# Altium footprint library Library.PcbLib: 308 footprints (part 10 of 21)
Each footprint in its own frame and in the unit in brackets; x right, y up, seen from the top. Pads: shape width x height; smd on the part's side, far side on the other; paste and mask are expansions set on the pad; w line width, h text height; cw(c..) or ccw(c..) is an arc to the next point about the centre after c.
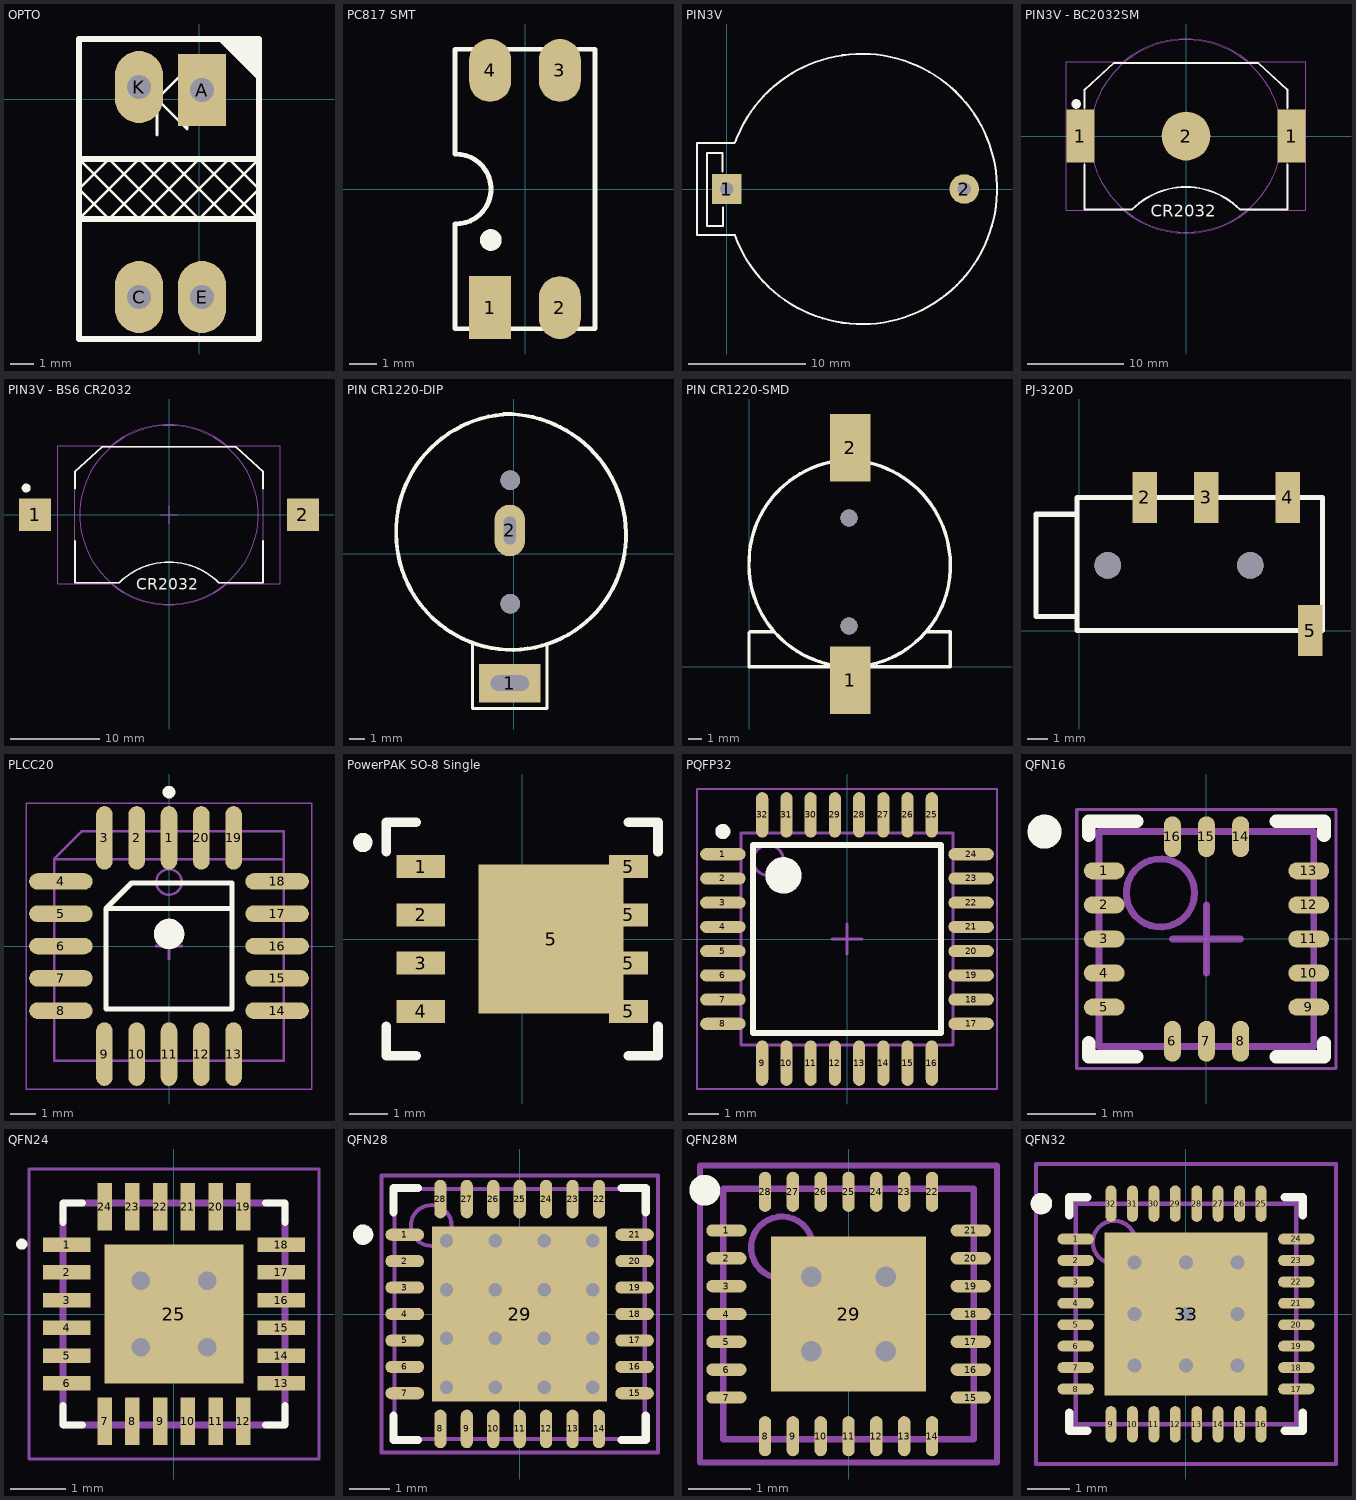
[diagram p9: the footprints below, top view; thin cyan lines are the x and y axes]

## OPTO [mil] "Opto hinh chu U"
height 104.33
pads (4):
  rect 80x120 hole 40: A(5,15)
  oval 80x120 hole 40: C(-100,-330) E(5,-330) K(-100,20)
Top Overlay:
  region: 97.5,97.5 32.5,97.5 97.5,32.5
  lines w5: -200,-200 -150,-150 -100,-100 0,-200 30,-170 100,-100 100,-200 0,-100 -100,-200 -110,-190 -140,-160 -200,-100 ; -70,-60 -70,60 ; -20,-50 -20,50 ; -20,-50 -20,50 ; -20,-50 -70,0 -20,50 ; -200,-150 -170,-180 -150,-200 -50,-100 50,-200 100,-150 50,-100 -50,-200 -150,-100 -200,-150
  lines w10: -200,-200 100,-200 ; -200,-150 -200,-110 ; -200,-100 100,-100 ; 100,-150 100,-140 ; -200,-400 100,-400 100,100 -200,100 -200,-400
3D body "SW3dPS-ee-sx-1041.STEP": height 394.3, standoff -196.25, extent -166,-430.59 70.22,120.59

## PC817 SMT [mil]
pads (4):
  rect 60x90 smd: 1(-50,-169.69)
  oval 60x90 smd: 2(50,-169.69) 3(50,169.69) 4(-50,169.69)
Top Overlay:
  circle w15: c-49,-73 r8
  lines w7: -100.38,-49.95 ccw(c-98.69,0.02) -100,50 ; -100,-50 -100,-200 100,-200 100,200 -100,200 -100,51
3D body "User Library-PC817_Gullwing.STEP": height 151.57, standoff -0.06, extent -90.16,-196.85 90.16,196.85

## PIN3V [mil] "Socket PIN 3V"
pads (2):
  rect 100x100 hole 45: 1(0,0)
  round 100 hole 45: 2(800,0)
Top Overlay:
  lines w7: -14,59 -14,121 -66,121 -66,-124 -13,-124 -13,-63 ; 26.33,155 -100,155 -100,-155 27.93,-155 ; 27.6,156.07 cw(c455,0) 27.93,-156.97
3D body "batter2.STEP": height 278.16, standoff -137.2, extent -128.09,-446.83 1001.83,448.83

## PIN3V - BC2032SM [mm] "CN-DIN, 3-Leads, Body 21.08x15.24mm"
height 4.57
pads (3):
  rect 2.9x5.5 smd: 1(-10.985,0) 1(10.985,0)
  round 5.08 smd: 2(0,0)
Top Overlay:
  circle w0.5: c-11.426,3.34 r0.25
  lines w0.2: -10.54,-2.94 -10.54,-7.62 -5.59,-7.62 cw(c0,-13.21) 5.591,-7.62 10.541,-7.62 ; -10.54,2.94 -10.54,4.83 -7.49,7.62 7.49,7.62 ; 7.49,7.621 10.54,4.83 10.54,2.94 ; 10.54,-7.62 10.54,-2.94
  text "CR2032" at -3.683,-8.382 h1.27
Mechanical 13:
  circle w0.1: c0,0 r10
  lines w0.1: 7.49,7.62 -7.49,7.62 -10.54,4.83 -10.54,2.94 -10.54,-2.94 -10.54,-7.62 -5.59,-7.62 cw(c0,-13.21) 5.591,-7.62 10.541,-7.62 ; 7.49,7.621 10.54,4.83 10.54,2.94 10.54,-2.94 10.54,-7.62
Mechanical 15:
  lines w0.05: -6.492,-7.737 ccw(c0,0) 6.492,-7.737 ; -6.492,7.72 -12.48,7.72 -12.48,-7.72 -6.477,-7.72 ; -6.492,7.738 cw(c0,0) 6.491,7.738 ; 6.477,-7.72 12.48,-7.72 12.48,7.72 6.491,7.72
  lines w0.1: -1,0 1,0 ; 0,-1 0,1
3D body: height 0.25, standoff 0, extent -1272.54,-1272.54 -1267.46,-1267.46
3D body "Linx 2032 Battery Holder.sldprt": height 4.4, standoff 0, extent -11.684,-7.688 11.816,7.366

## PIN3V - BS6 CR2032 [mm]
pads (2):
  rect 3.6x3.6 smd: 1(-15,0) 2(15,0)
Top Overlay:
  circle w0.5: c-16,3 r0.25
  lines w0.2: -10.54,-2.94 -10.54,-7.62 -5.59,-7.62 cw(c0.001,-13.21) 5.591,-7.62 10.541,-7.62 ; -10.54,2.94 -10.54,4.83 -7.49,7.62 7.49,7.62 10.54,4.83 10.54,2.94 ; 10.54,-7.62 10.54,-2.94
  text "CR2032" at -3.683,-8.382 h1.27
Mechanical 13:
  circle w0.1: c0,0 r10
  lines w0.1: 10.54,-7.62 10.54,-2.94 10.54,2.94 10.54,4.83 7.49,7.621 -7.49,7.62 -10.54,4.83 -10.54,2.94 -10.54,-2.94 -10.54,-7.62 -5.59,-7.62 cw(c0.001,-13.21) 5.591,-7.62 10.541,-7.62
Mechanical 15:
  lines w0.05: -6.492,7.72 -12.48,7.72 -12.48,-7.72 -6.477,-7.72 ; -6.492,7.737 cw(c0,0) 6.492,7.737 ; -6.492,-7.737 ccw(c0,0) 6.492,-7.737 ; 6.477,-7.72 12.48,-7.72 12.48,7.72 6.492,7.72
  lines w0.1: -1,0 1,0 ; 0,-1 0,1
3D body "xb-06-b4aa002.stp": height 5.5, standoff 0, extent -15.85,-8 15.85,8

## PIN CR1220-DIP [mm]
height 0.7
pads (2):
  rect 4x2.5 hole 1 slot 2.5 at 0 deg: 1(-0.254,-8.382)
  oval 2x3.353 hole 0.8 slot 1.8 at 90 deg: 2(-0.254,1.524)
via -0.22,4.777 diameter 1.27 hole 1.27
via -0.22,-3.223 diameter 1.27 hole 1.27
Top Overlay:
  lines w0.2: -2.413,-5.842 -2.667,-5.842 -2.667,-10.033 2.159,-10.033 2.159,-5.842
  lines w0.254: -0.62,9.077 cw(c-0.52,1.277) 7.28,1.377 cw(c-0.17,1.227) -0.02,-6.223 cw(c-0.07,1.327) -7.62,1.277 cw(c-0.02,1.477) -0.22,9.077
3D body "500_HOLDER BATT PC COIN 1CELL 12MM.stp": height 3, standoff -9.4, extent -7.804,-9.976 7.296,9.074

## PIN CR1220-SMD [mm]
height 0.7
pads (2):
  rect 3x5 smd: 1(7.5,-1) 2(7.5,16.2)
via 7.4,11 diameter 1.27 hole 1.27
via 7.4,3 diameter 1.27 hole 1.27
Top Overlay:
  lines w0.254: 0,2.5 0,0 14.9,0 ; 0.1,2.6 1.8,2.6 ; 7,15.3 cw(c7.1,7.5) 14.9,7.6 cw(c7.45,7.45) 7.6,0 cw(c7.55,7.55) 0,7.5 cw(c7.6,7.7) 7.4,15.3 ; 13.1,2.6 14.9,2.6 14.9,0 ; 14.9,0.1 14.9,2.5 ; 14.9,0.2 14.9,0
3D body "500_HOLDER BATT PC COIN 1CELL 12MM.stp": height 3, standoff -9.4, extent -0.184,-3.753 14.916,15.297

## PJ-320D [mm] "Jack Audio 3.5MM PJ-320D 4P"
pads (6):
  rect 1.2x2.5 smd: 2(3.2,6.5) 3(6.2,6.5) 4(10.2,6.5) 5(11.3,0)
  round 1.3 hole 1.3 mask+0: ""(1.399,3.181) ""(8.366,3.181)
Top Overlay:
  lines w0.254: -2.107,0.681 -0.107,0.681 -0.107,5.681 -2.107,5.681 -2.107,0.681 ; -0.107,0 -0.107,6.5 11.893,6.5 11.893,0 -0.107,0
3D body "PJ320D.STEP": height 5.45, standoff -0.55, extent -2.107,-0.927 11.893,7.352

## PLCC20 [mm] "Leaded Chip Carrier, 20-Leads, Body 9.90x9.90mm, Pitch 1.270mm, IPC Medium Density"
height 4.57
pads (20):
  oval 0.65x2.5 smd: 1(0,4.252) 2(-1.27,4.252) 3(-2.54,4.252) 9(-2.54,-4.252) 10(-1.27,-4.252) 11(0,-4.252) 12(1.27,-4.252) 13(2.54,-4.252) 19(2.54,4.252) 20(1.27,4.252)
  oval 2.5x0.65 smd: 4(-4.252,2.54) 5(-4.252,1.27) 6(-4.252,0) 7(-4.252,-1.27) 8(-4.252,-2.54) 14(4.252,-2.54) 15(4.252,-1.27) 16(4.252,0) 17(4.252,1.27) 18(4.252,2.54)
Top Overlay:
  circle w0.25: c0,6.052 r0.125
  circle w0.6: c0,0.475 r0.3
  lines w0.2: 2.475,1.475 -2.475,1.475 ; -2.475,1.475 -1.475,2.475 2.475,2.475 2.475,-2.475 -2.475,-2.475 -2.475,1.475
Mechanical 13:
  circle w0.1: c0,2.52 r0.5
  lines w0.1: 4.52,3.42 -4.52,3.42 ; -4.52,3.42 -4.52,-4.52 4.52,-4.52 4.52,4.52 -3.42,4.52 -4.52,3.42
Mechanical 15:
  lines w0.05: -5.625,-5.625 -5.625,5.625 5.625,5.625 5.625,-5.625 -5.625,-5.625
  lines w0.1: -0.5,0 0.5,0 ; 0,-0.5 0,0.5
3D body "CircuitWorks-PLCC20.step": height 4.57, standoff -0.2, extent -5.295,-5.041 5.041,5.295

## PowerPAK SO-8 Single [mm]
pads (9):
  rect 1.27x0.61 smd: 1(-2.667,1.905) 2(-2.667,0.635) 3(-2.667,-0.635) 4(-2.667,-1.905)
  rect 3.81x3.91 smd: 5(0.762,0)
  rect 1.02x0.61 smd: 5(2.798,-1.905) 5(2.798,-0.635) 5(2.798,0.635) 5(2.798,1.905)
Top Overlay:
  circle w0.254: c-4.191,2.54 r0.127
  lines w0.254: -3.575,-2.291 -3.575,-3.075 -2.791,-3.075 ; -3.575,2.291 -3.575,3.075 -2.791,3.075 ; 2.791,-3.075 3.575,-3.075 3.575,-2.291 ; 2.791,3.075 3.575,3.075 3.575,2.291
3D body "User Library-PowerPAK SO-8 (S).step": height 1.04, standoff 0, extent -3.075,-2.575 3.075,2.575

## PQFP32 [mm] "PQFP, 32-Leads, Body 7.00x7.00mm, Pitch 0.80mm, IPC High Density"
height 1.6
pads (32):
  oval 1.5x0.4 smd: 1(-4.1,2.8) 2(-4.1,2) 3(-4.1,1.2) 4(-4.1,0.4) 5(-4.1,-0.4) 6(-4.1,-1.2) 7(-4.1,-2) 8(-4.1,-2.8) 17(4.1,-2.8) 18(4.1,-2) 19(4.1,-1.2) 20(4.1,-0.4) 21(4.1,0.4) 22(4.1,1.2) 23(4.1,2) 24(4.1,2.8)
  oval 0.4x1.5 smd: 9(-2.8,-4.1) 10(-2,-4.1) 11(-1.2,-4.1) 12(-0.4,-4.1) 13(0.4,-4.1) 14(1.2,-4.1) 15(2,-4.1) 16(2.8,-4.1) 25(2.8,4.1) 26(2,4.1) 27(1.2,4.1) 28(0.4,4.1) 29(-0.4,4.1) 30(-1.2,4.1) 31(-2,4.1) 32(-2.8,4.1)
Top Overlay:
  circle w0.25: c-4.1,3.55 r0.125
  circle w0.6: c-2.1,2.1 r0.3
  lines w0.2: -3.1,-3.1 -3.1,3.1 3.1,3.1 3.1,-3.1 -3.1,-3.1
Mechanical 13:
  circle w0.1: c-2.6,2.6 r0.5
  lines w0.1: -3.5,-3.5 -3.5,3.5 3.5,3.5 3.5,-3.5 -3.5,-3.5
Mechanical 15:
  lines w0.05: -4.953,-4.953 -4.953,4.953 4.953,4.953 4.953,-4.953 -4.953,-4.953
  lines w0.1: -0.5,0 0.5,0 ; 0,-0.5 0,0.5
3D body "User Library-S-PQFP-G32.step": height 1.45, standoff -0.1, extent -4.627,-4.5 4.373,4.5

## QFN16 [mm] "PQFN, 16-Leads, Body 3x3mm, Pitch 0.5mm, IPC High Density"
height 1
pads (16):
  oval 0.6x0.25 smd: 1(-1.5,1) 2(-1.5,0.5) 3(-1.5,0) 4(-1.5,-0.5) 5(-1.5,-1) 9(1.5,-1) 10(1.5,-0.5) 11(1.5,0) 12(1.5,0.5) 13(1.5,1)
  oval 0.25x0.6 smd: 6(-0.5,-1.5) 7(0,-1.5) 8(0.5,-1.5) 14(0.5,1.5) 15(0,1.5) 16(-0.5,1.5)
Top Overlay:
  circle w0.25: c-2.375,1.575 r0.125
  lines w0.2: -1.725,-1.525 -1.725,-1.725 -1.025,-1.725 ; -1.725,1.525 -1.725,1.725 -1.025,1.725 ; 1.025,-1.725 1.725,-1.725 1.725,-1.525 ; 1.025,1.725 1.725,1.725 1.725,1.525
Mechanical 13:
  circle w0.1: c-0.675,0.675 r0.5
  lines w0.1: -1.575,-1.575 -1.575,1.575 1.575,1.575 1.575,-1.575 -1.575,-1.575
Mechanical 15:
  lines w0.05: -1.9,-1.9 -1.9,1.9 1.9,1.9 1.9,-1.9 -1.9,-1.9
  lines w0.1: -0.5,0 0.5,0 ; 0,-0.5 0,0.5
3D body: height 1, standoff 0, extent -1.575,-1.575 1.575,1.575

## QFN24 [mm]
pads (25):
  rrect7% 0.86x0.26 smd: 1(-1.935,1.25) 2(-1.935,0.75) 3(-1.935,0.25) 4(-1.935,-0.25) 5(-1.935,-0.75) 6(-1.935,-1.25) 13(1.935,-1.25) 14(1.935,-0.75) 15(1.935,-0.25) 16(1.935,0.25) 17(1.935,0.75) 18(1.935,1.25)
  rrect7% 0.26x0.86 smd: 7(-1.25,-1.935) 8(-0.75,-1.935) 9(-0.25,-1.935) 10(0.25,-1.935) 11(0.75,-1.935) 12(1.25,-1.935) 19(1.25,1.935) 20(0.75,1.935) 21(0.25,1.935) 22(-0.25,1.935) 23(-0.75,1.935) 24(-1.25,1.935)
  rect 2.5x2.5 smd paste-2: 25(0,0)
via 0.6,0.6 diameter 0.66 hole 0.33
via 0.6,-0.6 diameter 0.66 hole 0.33
via -0.6,-0.6 diameter 0.66 hole 0.33
via -0.6,0.6 diameter 0.66 hole 0.33
Top Overlay:
  circle w0.1: c-2.745,1.26 r0.05
  lines w0.127: -2,-1.65 -2,-2 -1.65,-2 ; -2,1.65 -2,2 -1.65,2 ; 1.65,-2 2,-2 2,-1.65 ; 1.65,2 2,2 2,1.65
Top Paste:
  region: 1.09,-1.09 0.17,-1.09 0.17,-0.17 1.09,-0.17
  region: -0.17,-1.092 -1.092,-1.092 -1.092,-0.17 -0.17,-0.17
  region: -0.17,0.17 -1.091,0.17 -1.091,1.09 -0.17,1.09
  region: 1.09,0.17 0.17,0.17 0.17,1.09 1.09,1.09
Mechanical 13:
  circle w0.1: c-2.195,1.26 r0.05
  lines w0.127: -2,-2 -2,2 2,2 2,-2 -2,-2
Mechanical 15:
  lines w0.05: -2.615,-2.615 -2.615,2.615 2.615,2.615 2.615,-2.615 -2.615,-2.615
3D body "step_temp.STEP": height 0.95, standoff -0.05, extent -2,-2 2,2

## QFN28 [mm] "QFN, 28-Leads, Body 5.75x5.75mm, Pitch 0.65mm, Thermal Pad 3.70x3.70mm, IPC Medium Density"
height 0.8
pads (29):
  oval 0.95x0.3 smd: 1(-2.825,1.95) 2(-2.825,1.3) 3(-2.825,0.65) 4(-2.825,0) 5(-2.825,-0.65) 6(-2.825,-1.3) 7(-2.825,-1.95) 15(2.825,-1.95) 16(2.825,-1.3) 17(2.825,-0.65) 18(2.825,0) 19(2.825,0.65) 20(2.825,1.3) 21(2.825,1.95)
  oval 0.3x0.95 smd: 8(-1.95,-2.825) 9(-1.3,-2.825) 10(-0.65,-2.825) 11(0,-2.825) 12(0.65,-2.825) 13(1.3,-2.825) 14(1.95,-2.825) 22(1.95,2.825) 23(1.3,2.825) 24(0.65,2.825) 25(0,2.825) 26(-0.65,2.825) 27(-1.3,2.825) 28(-1.95,2.825)
  rect 4.3x4.3 smd: 29(0,0)
via 1.8,-1.8 diameter 0.66 hole 0.33
via 0.6,-1.8 diameter 0.66 hole 0.33
via -0.6,-1.8 diameter 0.66 hole 0.33
via -1.8,-1.8 diameter 0.66 hole 0.33
via 1.8,-0.6 diameter 0.66 hole 0.33
via 0.6,-0.6 diameter 0.66 hole 0.33
via -0.6,-0.6 diameter 0.66 hole 0.33
via -1.8,-0.6 diameter 0.66 hole 0.33
via 1.8,0.6 diameter 0.66 hole 0.33
via 0.6,0.6 diameter 0.66 hole 0.33
via -0.6,0.6 diameter 0.66 hole 0.33
via -1.8,0.6 diameter 0.66 hole 0.33
via 1.8,1.8 diameter 0.66 hole 0.33
via 0.6,1.8 diameter 0.66 hole 0.33
via -0.6,1.8 diameter 0.66 hole 0.33
via -1.8,1.8 diameter 0.66 hole 0.33
Top Overlay:
  circle w0.25: c-3.85,1.95 r0.125
  lines w0.2: -3.1,-2.5 -3.1,-3.1 -2.5,-3.1 ; -3.1,2.5 -3.1,3.1 -2.5,3.1 ; 2.5,-3.1 3.1,-3.1 3.1,-2.5 ; 2.5,3.1 3.1,3.1 3.1,2.5
Mechanical 13:
  circle w0.1: c-2.175,2.175 r0.5
  lines w0.1: -3.075,-3.075 3.075,-3.075 3.075,3.075 -3.075,3.075 -3.075,-3.075
Mechanical 15:
  lines w0.1: -0.5,0 0.5,0 ; 0,-0.5 0,0.5 ; -3.4,-3.4 3.4,-3.4 3.4,3.4 -3.4,3.4 -3.4,-3.4
3D body "SW3dPS-QFN-28.STEP": height 1.02, standoff -0.08, extent -3.048,-3 2.952,3

## QFN28M [mm] "QFN, 28-Leads, Body 4x4mm, Pitch 0.45mm, IPC High Density"
height 1
pads (29):
  oval 0.65x0.2 smd: 1(-1.975,1.35) 2(-1.975,0.9) 3(-1.975,0.45) 4(-1.975,0) 5(-1.975,-0.45) 6(-1.975,-0.9) 7(-1.975,-1.35) 15(1.975,-1.35) 16(1.975,-0.9) 17(1.975,-0.45) 18(1.975,0) 19(1.975,0.45) 20(1.975,0.9) 21(1.975,1.35)
  oval 0.2x0.65 smd: 8(-1.35,-1.975) 9(-0.9,-1.975) 10(-0.45,-1.975) 11(0,-1.975) 12(0.45,-1.975) 13(0.9,-1.975) 14(1.35,-1.975) 22(1.35,1.975) 23(0.9,1.975) 24(0.45,1.975) 25(0,1.975) 26(-0.45,1.975) 27(-0.9,1.975) 28(-1.35,1.975)
  rect 2.5x2.5 smd: 29(0,0)
via 0.6,-0.6 diameter 0.66 hole 0.33
via -0.6,-0.6 diameter 0.66 hole 0.33
via 0.6,0.6 diameter 0.66 hole 0.33
via -0.6,0.6 diameter 0.66 hole 0.33
Top Overlay:
  circle w0.25: c-2.325,2 r0.125
Mechanical 13:
  circle w0.1: c-1.075,1.075 r0.5
  lines w0.1: -2.025,-2.025 2.025,-2.025 2.025,2.025 -2.025,2.025 -2.025,-2.025
Mechanical 15:
  lines w0.1: -0.5,0 0.5,0 ; 0,-0.5 0,0.5 ; -2.4,-2.4 2.4,-2.4 2.4,2.4 -2.4,2.4 -2.4,-2.4
3D body "User Library-QFN28-0_4.STEP": height 0.75, standoff 0, extent -2.025,-2 1.975,2

## QFN32 [mm] "QFN, 32-Leads, Body 5x5 mm, Pitch 0.5mm, IPC High Density"
height 1
pads (33):
  oval 0.85x0.254 smd: 1(-2.575,1.75) 2(-2.575,1.25) 3(-2.575,0.75) 4(-2.575,0.25) 5(-2.575,-0.25) 6(-2.575,-0.75) 7(-2.575,-1.25) 8(-2.575,-1.75) 17(2.575,-1.75) 18(2.575,-1.25) 19(2.575,-0.75) 20(2.575,-0.25) 21(2.575,0.25) 22(2.575,0.75) 23(2.575,1.25) 24(2.575,1.75)
  oval 0.254x0.85 smd: 9(-1.75,-2.575) 10(-1.25,-2.575) 11(-0.75,-2.575) 12(-0.25,-2.575) 13(0.25,-2.575) 14(0.75,-2.575) 15(1.25,-2.575) 16(1.75,-2.575) 25(1.75,2.575) 26(1.25,2.575) 27(0.75,2.575) 28(0.25,2.575) 29(-0.25,2.575) 30(-0.75,2.575) 31(-1.25,2.575) 32(-1.75,2.575)
  rect 3.8x3.8 smd: 33(0,0)
via -1.2,1.2 diameter 0.66 hole 0.33
via 0,1.2 diameter 0.66 hole 0.33
via 1.2,1.2 diameter 0.66 hole 0.33
via -1.2,0 diameter 0.66 hole 0.33
via 0,0 diameter 0.66 hole 0.33
via 1.2,0 diameter 0.66 hole 0.33
via -1.2,-1.2 diameter 0.66 hole 0.33
via 0,-1.2 diameter 0.66 hole 0.33
via 1.2,-1.2 diameter 0.66 hole 0.33
Top Overlay:
  circle w0.25: c-3.375,2.575 r0.125
  lines w0.2: -2.725,-2.3 -2.725,-2.725 -2.3,-2.725 ; -2.725,2.3 -2.725,2.725 -2.3,2.725 ; 2.3,-2.725 2.725,-2.725 2.725,-2.3 ; 2.3,2.725 2.725,2.725 2.725,2.3
Mechanical 13:
  circle w0.1: c-1.675,1.675 r0.5
  lines w0.1: -2.575,-2.575 -2.575,2.575 2.575,2.575 2.575,-2.575 -2.575,-2.575
Mechanical 15:
  lines w0.1: -0.5,0 0.5,0 ; 0,-0.5 0,0.5 ; -3.5,-3.5 -3.5,3.5 3.5,3.5 3.5,-3.5 -3.5,-3.5
3D body "Circuit integre ATMEGA 16U2.SLDPRT": height 1.15, standoff 0, extent -2.757,-2.851 2.743,2.749